# Altium footprint library Custom1.PcbLib: 554 footprints (part 29 of 35)
Each footprint in its own frame and in the unit in brackets; x right, y up, seen from the top. Pads: shape width x height; smd on the part's side, far side on the other; paste and mask are expansions set on the pad; w line width, h text height; cw(c..) or ccw(c..) is an arc to the next point about the centre after c.
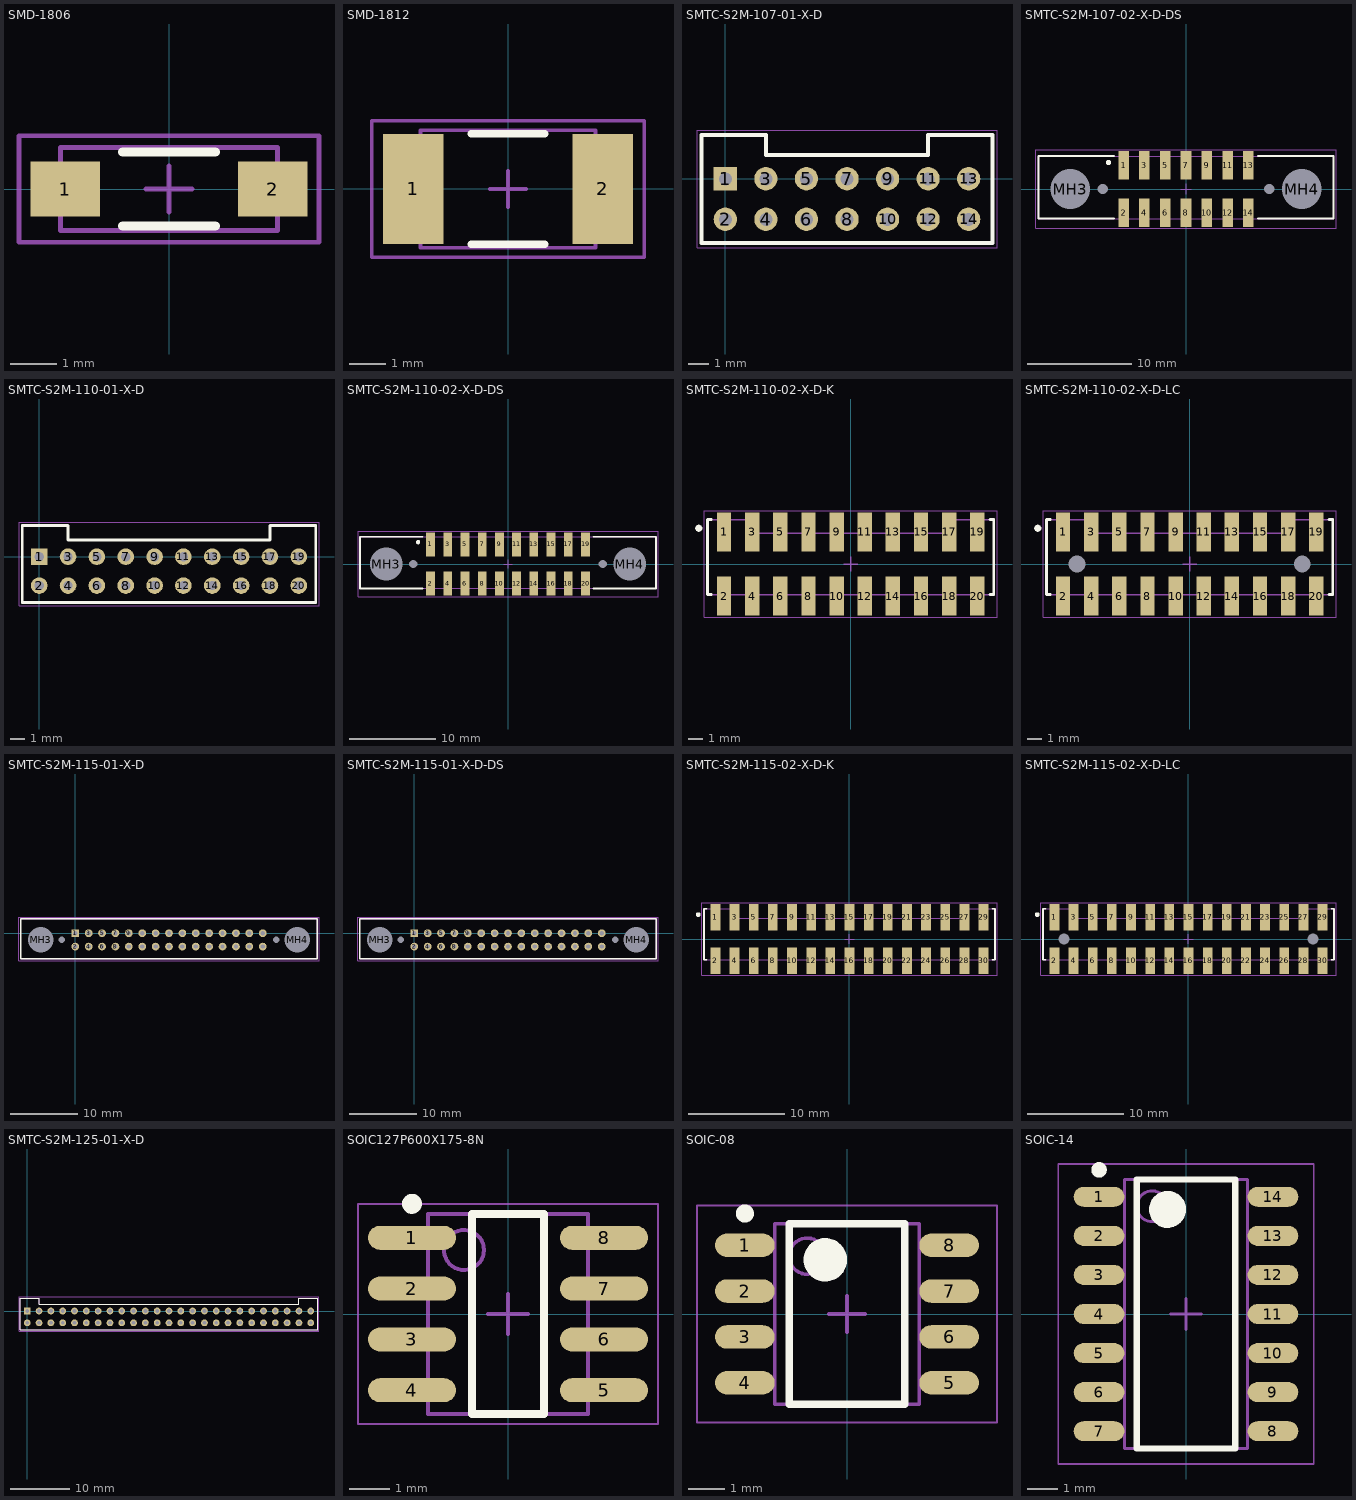
[diagram p28: the footprints below, top view; thin cyan lines are the x and y axes]

## SMD-1806 [mm] "Chip Inductor, 2-Leads, Body 4.5x1.6x1.8 mm"
height 1.8
pads (2):
  rect 1.5x1.2 smd: 1(-2.25,0) 2(2.25,0)
Top Overlay:
  lines w0.2: -1,-0.8 1,-0.8 ; -1,0.8 1,0.8
Mechanical 13:
  lines w0.1: -2.35,-0.9 -2.35,0.9 2.35,0.9 2.35,-0.9 -2.35,-0.9
Mechanical 15:
  lines w0.1: -0.5,0 0.5,0 ; 0,-0.5 0,0.5 ; -3.25,-1.15 -3.25,1.15 3.25,1.15 3.25,-1.15 -3.25,-1.15
3D body "74279243.stp": height -0.41, standoff -2.01, extent -2.25,-0.8 2.25,0.8

## SMD-1812 [mm] "Chip Inductor, 2-Leads, Body 4.5x3.2x1.7 mm"
height 1.7
pads (2):
  rect 1.65x3 smd: 1(-2.575,0) 2(2.575,0)
Top Overlay:
  lines w0.2: -1,-1.5 1,-1.5 ; -1,1.5 1,1.5
Mechanical 13:
  lines w0.1: -2.375,-1.6 -2.375,1.6 2.375,1.6 2.375,-1.6 -2.375,-1.6
Mechanical 15:
  lines w0.1: -0.5,0 0.5,0 ; 0,-0.5 0,0.5 ; -3.7,-1.85 -3.7,1.85 3.7,1.85 3.7,-1.85 -3.7,-1.85
3D body "74279252.stp": height 1.49, standoff -0.01, extent -2.25,-1.6 2.25,1.6

## SMTC-S2M-107-01-X-D [mm] "Socket Strip, 2x7 Pins, Vertical, 2mm Pitch, Female"
height 4.52
pads (14):
  rect 1.15x1.15 hole 0.64: 1(0,0)
  round 1.15 hole 0.64: 2(0,-2) 3(2,0) 4(2,-2) 5(4,0) 6(4,-2) 7(6,0) 8(6,-2) 9(8,0) 10(8,-2) 11(10,0) 12(10,-2) 13(12,0) 14(12,-2)
Top Overlay:
  lines w0.2: -1.175,-3.17 13.175,-3.17 13.175,2.16 9.995,2.16 9.995,1.17 2.005,1.17 2.005,2.16 -1.175,2.16 -1.175,-3.17
Mechanical 13:
  lines w0.1: -1.175,-3.17 13.175,-3.17 13.175,2.16 9.995,2.16 9.995,1.17 2.005,1.17 2.005,2.16 -1.175,2.16 -1.175,-3.17
Mechanical 15:
  lines w0.05: -1.4,-3.395 13.4,-3.395 13.4,2.385 -1.4,2.385 -1.4,-3.395
3D body "S2M-107-01-X-D.step": height 4.52, standoff -2.08, extent -1.175,-3.17 13.175,2.163

## SMTC-S2M-107-02-X-D-DS [mm] "Socket Strip, 2x7 Pins, Vertical, 2mm Pitch, Female"
height 5.969
pads (18):
  rect 1.02x2.77 smd: 1(-6,2.275) 2(-6,-2.275) 3(-4,2.275) 4(-4,-2.275) 5(-2,2.275) 6(-2,-2.275) 7(0,2.275) 8(0,-2.275) 9(2,2.275) 10(2,-2.275) 11(4,2.275) 12(4,-2.275) 13(6,2.275) 14(6,-2.275)
  round 0.67 hole 0.97: MH1(-8,0) MH2(8,0)
  round 3.51 hole 3.81 unplated: MH3(-11.14,0) MH4(11.14,0)
Top Overlay:
  circle w0.25: c-7.445,2.54 r0.125
  lines w0.2: -6.91,-2.838 -14.19,-2.838 -14.19,3.162 -6.91,3.162 ; 6.91,-2.838 14.19,-2.838 14.19,3.162 6.91,3.162
Mechanical 13:
  lines w0.1: -14.19,-2.838 -14.19,3.162 14.19,3.162 14.19,-2.838 -14.19,-2.838
Mechanical 15:
  lines w0.05: -14.415,-3.785 -14.415,3.785 14.415,3.785 14.415,-3.785 -14.415,-3.785
  lines w0.1: -0.5,0 0.5,0 ; 0,-0.5 0,0.5
3D body "S2M-107-02-X-D-DS.step": height 5.97, standoff -2.53, extent -14.191,-3.149 14.191,3.149

## SMTC-S2M-110-01-X-D [mm] "Socket Strip, 2x10 Pins, Vertical, 2mm Pitch, Female"
height 4.52
pads (20):
  rect 1.15x1.15 hole 0.64: 1(0,0)
  round 1.15 hole 0.64: 2(0,-2) 3(2,0) 4(2,-2) 5(4,0) 6(4,-2) 7(6,0) 8(6,-2) 9(8,0) 10(8,-2) 11(10,0) 12(10,-2) 13(12,0) 14(12,-2) 15(14,0) 16(14,-2) 17(16,0) 18(16,-2) 19(18,0) 20(18,-2)
Top Overlay:
  lines w0.2: -1.175,-3.17 19.175,-3.17 19.175,2.16 15.995,2.16 15.995,1.17 2.005,1.17 2.005,2.16 -1.175,2.16 -1.175,-3.17
Mechanical 13:
  lines w0.1: -1.175,-3.17 19.175,-3.17 19.175,2.16 15.995,2.16 15.995,1.17 2.005,1.17 2.005,2.16 -1.175,2.16 -1.175,-3.17
Mechanical 15:
  lines w0.05: -1.4,-3.395 19.4,-3.395 19.4,2.385 -1.4,2.385 -1.4,-3.395
3D body "S2M-110-01-X-D.step": height 4.52, standoff -2.08, extent -1.175,-3.17 19.175,2.162

## SMTC-S2M-110-02-X-D-DS [mm] "Socket Strip, 2x10 Pins, Vertical, 2mm Pitch, Female"
height 6.38
pads (24):
  rect 1.02x2.77 smd: 1(-9,2.275) 2(-9,-2.275) 3(-7,2.275) 4(-7,-2.275) 5(-5,2.275) 6(-5,-2.275) 7(-3,2.275) 8(-3,-2.275) 9(-1,2.275) 10(-1,-2.275) 11(1,2.275) 12(1,-2.275) 13(3,2.275) 14(3,-2.275) 15(5,2.275) 16(5,-2.275) 17(7,2.275) 18(7,-2.275) 19(9,2.275) 20(9,-2.275)
  round 0.67 hole 0.97: MH1(-11,0) MH2(11,0)
  round 3.51 hole 3.81 unplated: MH3(-14.139,0) MH4(14.139,0)
Top Overlay:
  circle w0.25: c-10.445,2.54 r0.125
  lines w0.2: -9.91,-2.838 -17.19,-2.838 -17.19,3.162 -9.91,3.162 ; 9.91,-2.838 17.19,-2.838 17.19,3.162 9.91,3.162
Mechanical 13:
  lines w0.1: -17.19,-2.838 -17.19,3.162 17.19,3.162 17.19,-2.838 -17.19,-2.838
Mechanical 15:
  lines w0.05: -17.415,-3.785 -17.415,3.785 17.415,3.785 17.415,-3.785 -17.415,-3.785
  lines w0.1: -0.5,0 0.5,0 ; 0,-0.5 0,0.5
3D body "S2M-110-02-X-D-DS.step": height 6.38, standoff -2.53, extent -17.191,-3.149 17.192,3.149

## SMTC-S2M-110-02-X-D-K [mm] "Socket Strip, 2x10 Pins, Vertical, 2mm Pitch, Female"
height 4.83
pads (20):
  rect 1.02x2.77 smd: 1(-9,2.275) 2(-9,-2.275) 3(-7,2.275) 4(-7,-2.275) 5(-5,2.275) 6(-5,-2.275) 7(-3,2.275) 8(-3,-2.275) 9(-1,2.275) 10(-1,-2.275) 11(1,2.275) 12(1,-2.275) 13(3,2.275) 14(3,-2.275) 15(5,2.275) 16(5,-2.275) 17(7,2.275) 18(7,-2.275) 19(9,2.275) 20(9,-2.275)
Top Overlay:
  circle w0.25: c-10.795,2.54 r0.125
  lines w0.2: -9.91,-2.17 -10.175,-2.17 -10.175,3.16 -9.91,3.16 ; 9.91,-2.17 10.175,-2.17 10.175,3.16 9.91,3.16
Mechanical 13:
  lines w0.1: -10.175,-2.17 -10.175,3.16 -6.995,3.16 -6.995,2.17 6.995,2.17 6.995,3.16 10.175,3.16 10.175,-2.17 -10.175,-2.17
Mechanical 15:
  lines w0.05: -10.4,-3.785 -10.4,3.785 10.4,3.785 10.4,-3.785 -10.4,-3.785
  lines w0.1: -0.5,0 0.5,0 ; 0,-0.5 0,0.5
3D body "S2M-110-02-X-D-K.step": height 4.83, standoff 0, extent -10.175,-3.149 10.175,3.149

## SMTC-S2M-110-02-X-D-LC [mm] "Socket Strip, 2x10 Pins, Vertical, 2mm Pitch, Female"
height 4.65
pads (22):
  rect 1.02x2.77 smd: 1(-9,2.275) 2(-9,-2.275) 3(-7,2.275) 4(-7,-2.275) 5(-5,2.275) 6(-5,-2.275) 7(-3,2.275) 8(-3,-2.275) 9(-1,2.275) 10(-1,-2.275) 11(1,2.275) 12(1,-2.275) 13(3,2.275) 14(3,-2.275) 15(5,2.275) 16(5,-2.275) 17(7,2.275) 18(7,-2.275) 19(9,2.275) 20(9,-2.275)
  round 0.89 hole 1.19 unplated: MH1(-8,0) MH2(8,0)
Top Overlay:
  circle w0.25: c-10.795,2.54 r0.125
  lines w0.2: -9.91,-2.17 -10.175,-2.17 -10.175,3.16 -9.91,3.16 ; 9.91,-2.17 10.175,-2.17 10.175,3.16 9.91,3.16
Mechanical 13:
  lines w0.1: -10.175,-2.17 10.175,-2.17 10.175,3.16 6.995,3.16 6.995,2.17 -6.995,2.17 -6.995,3.16 -10.175,3.16 -10.175,-2.17
Mechanical 15:
  lines w0.05: -10.4,-3.785 10.4,-3.785 10.4,3.785 -10.4,3.785 -10.4,-3.785
  lines w0.1: -0.5,0 0.5,0 ; 0,-0.5 0,0.5
3D body "S2M-110-02-X-D-LC.step": height 4.65, standoff -1.4, extent -10.175,-3.149 10.175,3.149

## SMTC-S2M-115-01-X-D [mm] "Socket Strip, 2x15 Pins, Vertical, 2mm Pitch, Female"
height 6.25
pads (34):
  rect 1.15x1.15 hole 0.64: 1(0,0)
  round 1.15 hole 0.64: 2(0,-2) 3(2,0) 4(2,-2) 5(4,0) 6(4,-2) 7(6,0) 8(6,-2) 9(8,0) 10(8,-2) 11(10,0) 12(10,-2) 13(12,0) 14(12,-2) 15(14,0) 16(14,-2) 17(16,0) 18(16,-2) 19(18,0) 20(18,-2) 21(20,0) 22(20,-2) 23(22,0) 24(22,-2) 25(24,0) 26(24,-2) 27(26,0) 28(26,-2) 29(28,0) 30(28,-2)
  round 0.67 hole 0.97: MH1(-2,-1) MH2(30,-1)
  round 3.51 hole 3.81 unplated: MH3(-5.136,-1) MH4(33.136,-1)
Top Overlay:
  lines w0.2: -8.184,-3.838 36.184,-3.838 36.184,2.162 -8.184,2.162 -8.184,-3.838
Mechanical 13:
  lines w0.1: -8.184,-3.838 -8.184,2.162 36.184,2.162 36.184,-3.838 -8.184,-3.838
Mechanical 15:
  lines w0.05: -8.409,-4.125 36.409,-4.125 36.409,2.387 -8.409,2.387 -8.409,-4.125
3D body "S2M-115-01-X-D-DS.step": height 6.25, standoff -2.66, extent -8.191,-4 36.192,2.116

## SMTC-S2M-115-01-X-D-DS [mm] "Socket Strip, 2x15 Pins, Vertical, 2mm Pitch, Female"
height 6.25
pads (34):
  rect 1.15x1.15 hole 0.64: 1(0,0)
  round 1.15 hole 0.64: 2(0,-2) 3(2,0) 4(2,-2) 5(4,0) 6(4,-2) 7(6,0) 8(6,-2) 9(8,0) 10(8,-2) 11(10,0) 12(10,-2) 13(12,0) 14(12,-2) 15(14,0) 16(14,-2) 17(16,0) 18(16,-2) 19(18,0) 20(18,-2) 21(20,0) 22(20,-2) 23(22,0) 24(22,-2) 25(24,0) 26(24,-2) 27(26,0) 28(26,-2) 29(28,0) 30(28,-2)
  round 0.67 hole 0.97: MH1(-2,-1) MH2(30,-1)
  round 3.51 hole 3.81 unplated: MH3(-5.136,-1) MH4(33.136,-1)
Top Overlay:
  lines w0.2: -8.184,-3.838 36.184,-3.838 36.184,2.162 -8.184,2.162 -8.184,-3.838
Mechanical 13:
  lines w0.1: -8.184,-3.838 -8.184,2.162 36.184,2.162 36.184,-3.838 -8.184,-3.838
Mechanical 15:
  lines w0.05: -8.409,-4.125 36.409,-4.125 36.409,2.387 -8.409,2.387 -8.409,-4.125
3D body "S2M-115-01-X-D-DS.step": height 6.25, standoff -2.66, extent -8.191,-4 36.192,2.116

## SMTC-S2M-115-02-X-D-K [mm] "Socket Strip, 2x15 Pins, Vertical, 2mm Pitch, Female"
height 4.83
pads (30):
  rect 1.02x2.77 smd: 1(-14,2.275) 2(-14,-2.275) 3(-12,2.275) 4(-12,-2.275) 5(-10,2.275) 6(-10,-2.275) 7(-8,2.275) 8(-8,-2.275) 9(-6,2.275) 10(-6,-2.275) 11(-4,2.275) 12(-4,-2.275) 13(-2,2.275) 14(-2,-2.275) 15(0,2.275) 16(0,-2.275) 17(2,2.275) 18(2,-2.275) 19(4,2.275) 20(4,-2.275) 21(6,2.275) 22(6,-2.275) 23(8,2.275) 24(8,-2.275) 25(10,2.275) 26(10,-2.275) 27(12,2.275) 28(12,-2.275) 29(14,2.275) 30(14,-2.275)
Top Overlay:
  circle w0.25: c-15.795,2.54 r0.125
  lines w0.2: -14.91,-2.17 -15.175,-2.17 -15.175,3.16 -14.91,3.16 ; 14.91,-2.17 15.175,-2.17 15.175,3.16 14.91,3.16
Mechanical 13:
  lines w0.1: -15.175,-2.17 -15.175,3.16 -11.995,3.16 -11.995,2.17 11.995,2.17 11.995,3.16 15.175,3.16 15.175,-2.17 -15.175,-2.17
Mechanical 15:
  lines w0.05: -15.4,-3.785 15.4,-3.785 15.4,3.785 -15.4,3.785 -15.4,-3.785
  lines w0.1: -0.5,0 0.5,0 ; 0,-0.5 0,0.5
3D body "S2M-115-02-X-D-K.step": height 4.83, standoff 0, extent -15.175,-3.149 15.175,3.149

## SMTC-S2M-115-02-X-D-LC [mm] "Socket Strip, 2x15 Pins, Vertical, 2mm Pitch, Female"
height 4.65
pads (32):
  rect 1.02x2.77 smd: 1(-14,2.275) 2(-14,-2.275) 3(-12,2.275) 4(-12,-2.275) 5(-10,2.275) 6(-10,-2.275) 7(-8,2.275) 8(-8,-2.275) 9(-6,2.275) 10(-6,-2.275) 11(-4,2.275) 12(-4,-2.275) 13(-2,2.275) 14(-2,-2.275) 15(0,2.275) 16(0,-2.275) 17(2,2.275) 18(2,-2.275) 19(4,2.275) 20(4,-2.275) 21(6,2.275) 22(6,-2.275) 23(8,2.275) 24(8,-2.275) 25(10,2.275) 26(10,-2.275) 27(12,2.275) 28(12,-2.275) 29(14,2.275) 30(14,-2.275)
  round 0.89 hole 1.19 unplated: MH1(-13,0) MH2(13,0)
Top Overlay:
  circle w0.25: c-15.795,2.54 r0.125
  lines w0.2: -14.91,-2.17 -15.175,-2.17 -15.175,3.16 -14.91,3.16 ; 14.91,-2.17 15.175,-2.17 15.175,3.16 14.91,3.16
Mechanical 13:
  lines w0.1: -15.175,-2.17 -15.175,3.16 -11.995,3.16 -11.995,2.17 11.995,2.17 11.995,3.16 15.175,3.16 15.175,-2.17 -15.175,-2.17
Mechanical 15:
  lines w0.05: -15.4,-3.785 15.4,-3.785 15.4,3.785 -15.4,3.785 -15.4,-3.785
  lines w0.1: -0.5,0 0.5,0 ; 0,-0.5 0,0.5
3D body "S2M-115-02-X-D-LC.step": height 4.65, standoff -1.39, extent -15.175,-3.149 15.175,3.149

## SMTC-S2M-125-01-X-D [mm] "Socket Strip, 2x25 Pins, Vertical, 2mm Pitch, Female"
height 4.52
pads (50):
  rect 1.15x1.15 hole 0.64: 1(0,0)
  round 1.15 hole 0.64: 2(0,-2) 3(2,0) 4(2,-2) 5(4,0) 6(4,-2) 7(6,0) 8(6,-2) 9(8,0) 10(8,-2) 11(10,0) 12(10,-2) 13(12,0) 14(12,-2) 15(14,0) 16(14,-2) 17(16,0) 18(16,-2) 19(18,0) 20(18,-2) 21(20,0) 22(20,-2) 23(22,0) 24(22,-2) 25(24,0) 26(24,-2) 27(26,0) 28(26,-2) 29(28,0) 30(28,-2) 31(30,0) 32(30,-2) 33(32,0) 34(32,-2) 35(34,0) 36(34,-2) 37(36,0) 38(36,-2) 39(38,0) 40(38,-2) 41(40,0) 42(40,-2) 43(42,0) 44(42,-2) 45(44,0) 46(44,-2) 47(46,0) 48(46,-2) 49(48,0) 50(48,-2)
Top Overlay:
  lines w0.2: -1.175,-3.17 49.175,-3.17 49.175,2.16 45.995,2.16 45.995,1.17 2.005,1.17 2.005,2.16 -1.175,2.16 -1.175,-3.17
Mechanical 13:
  lines w0.1: -1.175,-3.17 49.175,-3.17 49.175,2.16 45.995,2.16 45.995,1.17 2.005,1.17 2.005,2.16 -1.175,2.16 -1.175,-3.17
Mechanical 15:
  lines w0.05: -1.4,-3.395 49.4,-3.395 49.4,2.385 -1.4,2.385 -1.4,-3.395
3D body "S2M-125-01-X-D.step": height 4.52, standoff -2.08, extent -1.175,-3.17 49.175,2.162

## SOIC127P600X175-8N [mm] "SOIC, 8-Leads, Body 4.90x3.90mm, Pitch 1.27mm, IPC Medium Density"
height 1.75
pads (8):
  oval 2.2x0.6 smd: 1(-2.4,1.905) 2(-2.4,0.635) 3(-2.4,-0.635) 4(-2.4,-1.905) 5(2.4,-1.905) 6(2.4,-0.635) 7(2.4,0.635) 8(2.4,1.905)
Top Overlay:
  circle w0.25: c-2.4,2.755 r0.125
  lines w0.2: -0.9,-2.5 -0.9,2.5 0.9,2.5 0.9,-2.5 -0.9,-2.5
Mechanical 13:
  circle w0.1: c-1.1,1.6 r0.5
  lines w0.1: -2,-2.5 -2,2.5 2,2.5 2,-2.5 -2,-2.5
Mechanical 15:
  lines w0.05: -3.75,-2.75 -3.75,2.75 3.75,2.75 3.75,-2.75 -3.75,-2.75
  lines w0.1: -0.5,0 0.5,0 ; 0,-0.5 0,0.5
3D body: height 1.75, standoff 1.35, extent -2,-2.5 2,2.5

## SOIC-08 [mm] "SOIC, 8-Leads, Body 5x4mm, Pitch 1.27mm, IPC Low Density"
height 1.75
pads (8):
  oval 1.65x0.65 smd: 1(-2.825,1.905) 2(-2.825,0.635) 3(-2.825,-0.635) 4(-2.825,-1.905) 5(2.825,-1.905) 6(2.825,-0.635) 7(2.825,0.635) 8(2.825,1.905)
Top Overlay:
  circle w0.25: c-2.825,2.78 r0.125
  circle w0.6: c-0.6,1.5 r0.3
  lines w0.2: -1.6,-2.5 -1.6,2.5 1.6,2.5 1.6,-2.5 -1.6,-2.5
Mechanical 13:
  circle w0.1: c-1.1,1.6 r0.5
  lines w0.1: -2,-2.5 -2,2.5 2,2.5 2,-2.5 -2,-2.5
Mechanical 15:
  lines w0.05: -4.15,-3 -4.15,3 4.15,3 4.15,-3 -4.15,-3
  lines w0.1: -0.5,0 0.5,0 ; 0,-0.5 0,0.5
3D body "SOIC-8akaD0008AakaM08A.stp": height 1.75, standoff 0, extent -3,-2.45 3,2.45

## SOIC-14 [mm] "SOIC, 14-Leads, Body 8.75x4mm, Pitch 1.27mm, IPC Low Density"
height 1.75
pads (14):
  oval 1.65x0.65 smd: 1(-2.825,3.81) 2(-2.825,2.54) 3(-2.825,1.27) 4(-2.825,0) 5(-2.825,-1.27) 6(-2.825,-2.54) 7(-2.825,-3.81) 8(2.825,-3.81) 9(2.825,-2.54) 10(2.825,-1.27) 11(2.825,0) 12(2.825,1.27) 13(2.825,2.54) 14(2.825,3.81)
Top Overlay:
  circle w0.25: c-2.825,4.685 r0.125
  circle w0.6: c-0.6,3.4 r0.3
  lines w0.2: -1.6,-4.375 -1.6,4.375 1.6,4.375 1.6,-4.375 -1.6,-4.375
Mechanical 13:
  circle w0.1: c-1.1,3.5 r0.5
  lines w0.1: -2,-4.375 -2,4.375 2,4.375 2,-4.375 -2,-4.375
Mechanical 15:
  lines w0.05: -4.15,-4.875 -4.15,4.875 4.15,4.875 4.15,-4.875 -4.15,-4.875
  lines w0.1: -0.5,0 0.5,0 ; 0,-0.5 0,0.5
3D body "SOIC-14akaD0014AakaM14A.stp": height 1.75, standoff -0.01, extent -3.023,-4.318 3.022,4.318